# Altium footprint library d1_PcbLib.PcbLib: 266 footprints (part 7 of 17)
Each footprint in its own frame and in the unit in brackets; x right, y up, seen from the top. Pads: shape width x height; smd on the part's side, far side on the other; paste and mask are expansions set on the pad; w line width, h text height; cw(c..) or ccw(c..) is an arc to the next point about the centre after c.
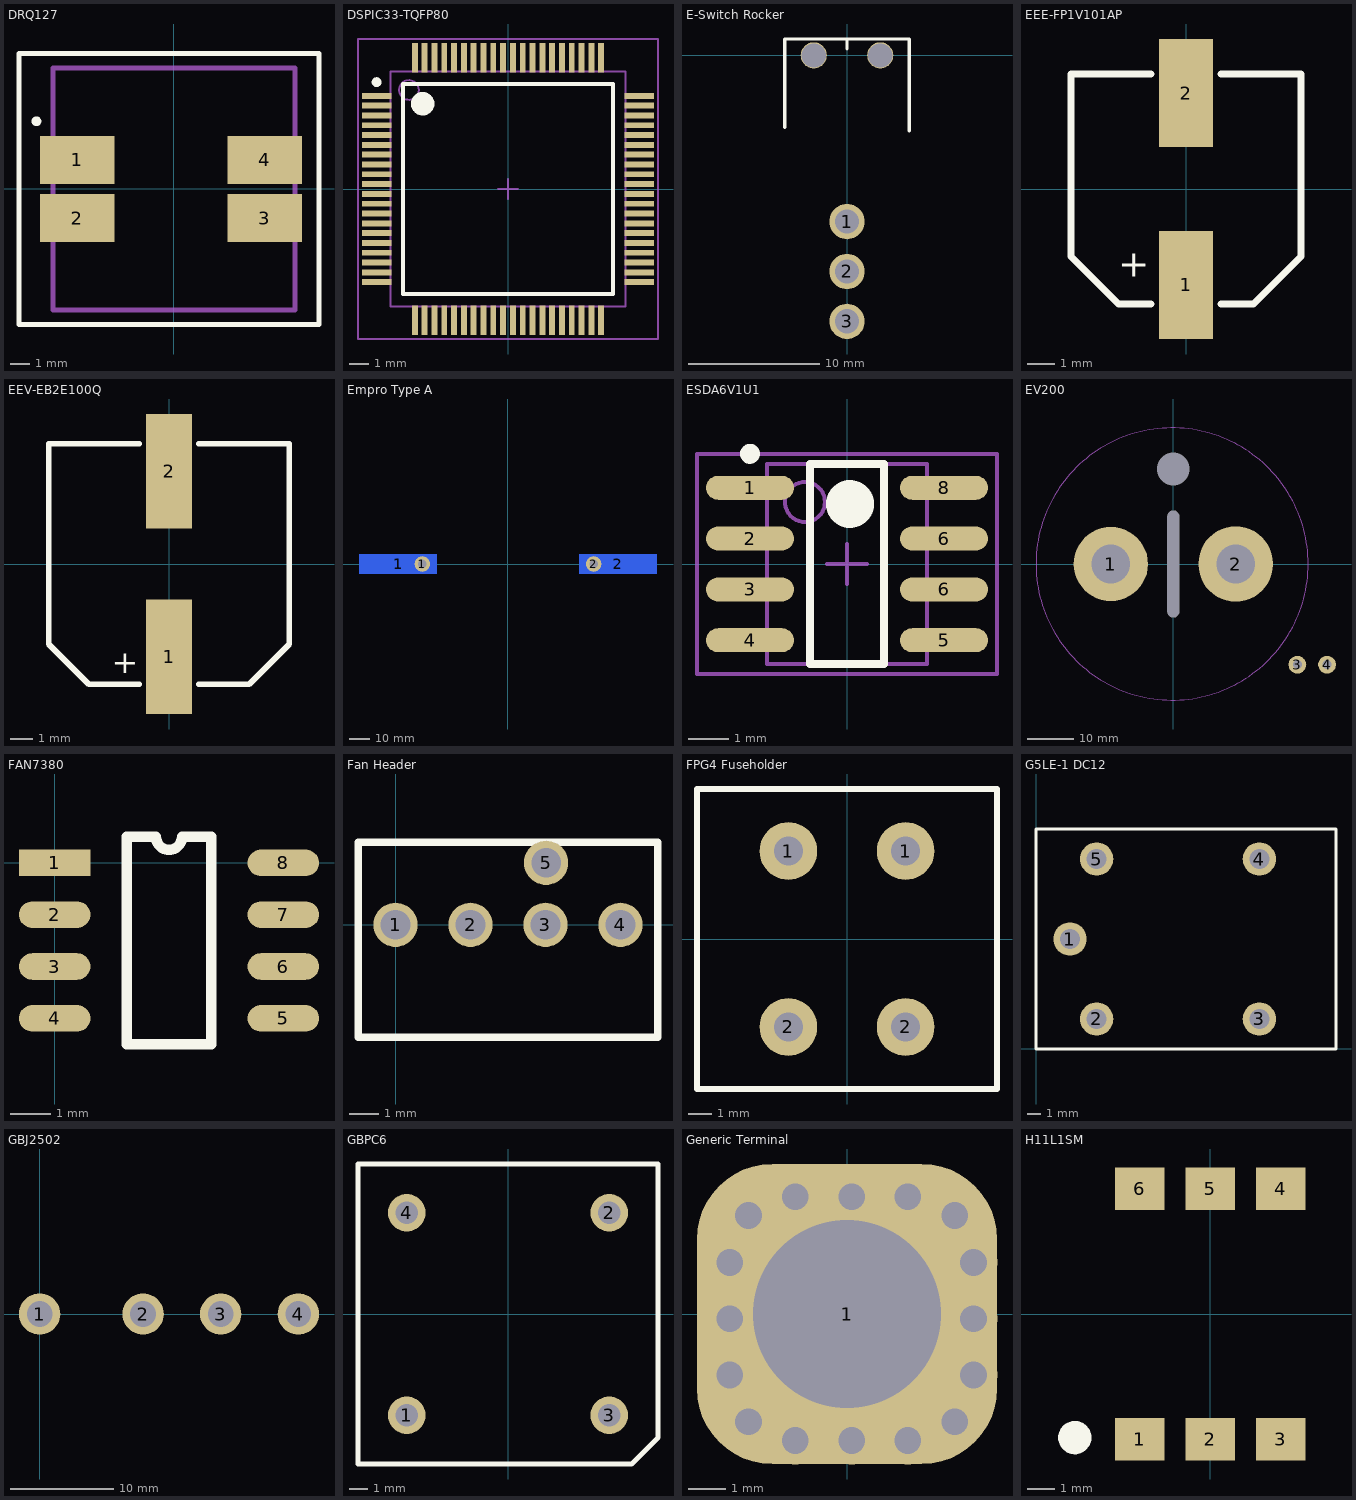
[diagram p6: the footprints below, top view; thin cyan lines are the x and y axes]

## DRQ127 [mm]
pads (4):
  rect 3.85x2.5 smd: 1(-5,1.5) 2(-5,-1.5) 3(4.7,-1.5) 4(4.7,1.5)
Top Overlay:
  circle w0.254: c-7.1,3.5 r0.125
  lines w0.254: -8,-7 -8,7 7.5,7 7.5,-7 -8,-7
Mechanical 1:
  lines w0.254: -6.25,-6.25 -6.25,6.25 6.25,6.25 6.25,-6.25 -6.25,-6.25
3D body: height 8, standoff 0, extent -6.25,-6.25 6.25,6.25

## DSPIC33-TQFP80 [mm] "TSQFP, 80-Leads, Body 14.0x14.0mm (max), Pitch 0.50mm, IPC Medium Density"
height 1.2
pads (80):
  rect 1.5x0.3 smd: 1(-6.7,4.75) 2(-6.7,4.25) 3(-6.7,3.75) 4(-6.7,3.25) 5(-6.7,2.75) 6(-6.7,2.25) 7(-6.7,1.75) 8(-6.7,1.25) 9(-6.7,0.75) 10(-6.7,0.25) 11(-6.7,-0.25) 12(-6.7,-0.75) 13(-6.7,-1.25) 14(-6.7,-1.75) 15(-6.7,-2.25) 16(-6.7,-2.75) 17(-6.7,-3.25) 18(-6.7,-3.75) 19(-6.7,-4.25) 20(-6.7,-4.75) 41(6.7,-4.75) 42(6.7,-4.25) 43(6.7,-3.75) 44(6.7,-3.25) 45(6.7,-2.75) 46(6.7,-2.25) 47(6.7,-1.75) 48(6.7,-1.25) 49(6.7,-0.75) 50(6.7,-0.25) 51(6.7,0.25) 52(6.7,0.75) 53(6.7,1.25) 54(6.7,1.75) 55(6.7,2.25) 56(6.7,2.75) 57(6.7,3.25) 58(6.7,3.75) 59(6.7,4.25) 60(6.7,4.75)
  rect 0.3x1.5 smd: 21(-4.75,-6.7) 22(-4.25,-6.7) 23(-3.75,-6.7) 24(-3.25,-6.7) 25(-2.75,-6.7) 26(-2.25,-6.7) 27(-1.75,-6.7) 28(-1.25,-6.7) 29(-0.75,-6.7) 30(-0.25,-6.7) 31(0.25,-6.7) 32(0.75,-6.7) 33(1.25,-6.7) 34(1.75,-6.7) 35(2.25,-6.7) 36(2.75,-6.7) 37(3.25,-6.7) 38(3.75,-6.7) 39(4.25,-6.7) 40(4.75,-6.7) 61(4.75,6.7) 62(4.25,6.7) 63(3.75,6.7) 64(3.25,6.7) 65(2.75,6.7) 66(2.25,6.7) 67(1.75,6.7) 68(1.25,6.7) 69(0.75,6.7) 70(0.25,6.7) 71(-0.25,6.7) 72(-0.75,6.7) 73(-1.25,6.7) 74(-1.75,6.7) 75(-2.25,6.7) 76(-2.75,6.7) 77(-3.25,6.7) 78(-3.75,6.7) 79(-4.25,6.7) 80(-4.75,6.7)
Top Overlay:
  circle w0.25: c-6.7,5.45 r0.125
  circle w0.6: c-4.35,4.35 r0.3
  lines w0.2: -5.35,-5.35 -5.35,5.35 5.35,5.35 5.35,-5.35 -5.35,-5.35
Mechanical 13:
  circle w0.1: c-5.05,5.05 r0.5
  lines w0.1: -6,-6 -6,6 6,6 6,-6 -6,-6
Mechanical 15:
  lines w0.1: -0.5,0 0.5,0 ; 0,-0.5 0,0.5 ; -7.65,-7.65 -7.65,7.65 7.65,7.65 7.65,-7.65 -7.65,-7.65
3D body: height 1.2, standoff 0.05, extent -6,-6 6,6

## E-Switch Rocker [mm] "For part 300SP1J1BLKM7QE"
pads (5):
  round 2.7 hole 1.85: 1(0,-12.7) 2(0,-16.51) 3(0,-20.32)
  round 2 hole 1.85: ""(-2.54,0) ""(2.54,0)
Top Overlay:
  lines w0.254: -4.75,-5.5 -4.75,-0.5 ; -4.75,-0.75 -4.75,1.25 ; -4.63,1.25 4.63,1.25 ; 0,0.5 0,1.25 ; 4.75,-5.75 4.75,-0.75 4.75,1.25
3D body: height 12.7, standoff 0, extent -4.699,-21.971 4.572,1.143

## EEE-FP1V101AP [mm]
pads (2):
  rect 2x4 smd: 1(0,-3.55) 2(0,3.55)
Top Overlay:
  lines w0.254: -1.3,-4.25 -2.5,-4.25 -4.25,-2.5 -4.25,4.25 -1.3,4.25 ; 1.3,-4.25 2.5,-4.25 4.25,-2.5 4.25,4.25 1.3,4.25
  text "+" at -2.5,-3.25 h1.02

## EEV-EB2E100Q [mm]
pads (2):
  rect 2x5 smd: 1(0,-4.05) 2(0,4.05)
Top Overlay:
  lines w0.254: -1.3,-5.25 -3.5,-5.25 -5.25,-3.5 -5.25,5.25 -1.3,5.25 ; 1.3,-5.25 3.5,-5.25 5.25,-3.5 5.25,5.25 1.3,5.25
  text "+" at -2.502,-4.763 h1.02

## Empro Type A [mil]
pads (4):
  rect 1500x375 smd far side: 1(-2125,0) 2(2125,0)
  round 300 hole 165: 1(-1656.25,0) 2(1656.25,0)
Bottom Overlay:
  lines w20: -2900,-211 -2900,210.5 2901.5,210.5 2901.5,-211 -2900,-211
3D body: height 625, standoff 0, extent -2875,-188 2875.5,187

## ESDA6V1U1 [mm] "SOP, 8-Leads, Body 5.0x4.0mm (max), Pitch 1.27mm, IPC Medium Density"
height 1.75
pads (8):
  oval 2.2x0.6 smd: 1(-2.425,1.905) 2(-2.425,0.635) 3(-2.425,-0.635) 4(-2.425,-1.905) 5(2.425,-1.905) 6(2.425,-0.635) 6(2.425,0.635) 8(2.425,1.905)
Top Overlay:
  circle w0.6: c0.075,1.5 r0.3
  circle w0.25: c-2.425,2.755 r0.125
  lines w0.2: -0.925,-2.5 0.925,-2.5 0.925,2.5 -0.925,2.5 -0.925,-2.5
Mechanical 13:
  circle w0.1: c-1.05,1.55 r0.5
  lines w0.1: -2,-2.5 2,-2.5 2,2.5 -2,2.5 -2,-2.5
Mechanical 15:
  lines w0.1: -0.5,0 0.5,0 ; 0,-0.5 0,0.5 ; -3.75,-2.75 3.75,-2.75 3.75,2.75 -3.75,2.75 -3.75,-2.75
3D body: height 1.75, standoff 0.19, extent -2,-2.5 2,2.5

## EV200 [mil]
pads (6):
  rrect50% 0x0 hole 100 slot 900 at 90 deg: 0(0,0)
  round 0 hole 275: 0(0,800)
  round 625 hole 325: 1(-525,0)
  oval 625x635 hole 325: 2(525,0)
  round 150 hole 75: 3(1044,-847) 4(1294,-847)
Mechanical 1:
  circle w10: c-10,0 r1145
3D body: height 1100, standoff -2200, extent -1579.61,-1436.52 1582,1144.52

## FAN7380 [mm]
height 5
pads (8):
  rect 1.75x0.65 smd: 1(0,0)
  oval 1.75x0.65 smd: 2(0,-1.27) 3(0,-2.54) 4(0,-3.81) 5(5.6,-3.81) 6(5.6,-2.54) 7(5.6,-1.27) 8(5.6,0)
Top Overlay:
  lines w0.254: 1.764,-4.445 3.836,-4.445 3.836,0.635 3.117,0.635 cw(c2.8,0.635) 2.482,0.635 1.764,0.635 1.764,-4.445

## Fan Header [mm] "4 Pin Fan Header"
height 10
pads (5):
  round 1.5 hole 1: 1(0,0) 2(2.54,0) 3(5.08,0) 4(7.62,0) 5(5.1,2.1)
Top Overlay:
  lines w0.254: -1.27,-3.81 8.89,-3.81 8.89,2.794 -1.27,2.794 -1.27,0 -1.27,-3.81
3D body: height 11.15, standoff -3.4, extent -1.185,-3.63 8.785,2.7

## FPG4 Fuseholder [mm] "Schurter 5mmx20mm Fuse Holder"
height 32.6
pads (4):
  round 2.5 hole 1.25: 1(-2.54,3.81) 1(2.54,3.81) 2(-2.54,-3.81) 2(2.54,-3.81)
Top Overlay:
  lines w0.254: -6.5,-6.5 -6.5,6.5 6.5,6.5 6.5,-6.5 -6.5,-6.5
3D body: height 32.6, standoff 0, extent -6.25,-6.25 6.201,6.225
3D body: height 3.8, standoff 0, extent -6.25,-6.25 6.25,6.25

## G5LE-1 DC12 [mm]
pads (5):
  round 2.5 hole 1.5: 1(2.55,8.25) 2(4.55,2.25) 3(16.75,2.25) 4(16.75,14.25) 5(4.55,14.25)
Top Overlay:
  lines w0.254: 0,0 0,16.5 22.5,16.5 22.5,0 0,0

## GBJ2502 [mm]
pads (4):
  round 4 hole 2.5: 1(0,0) 2(10,0) 3(17.5,0) 4(25,0)

## GBPC6 [mm]
pads (4):
  round 2 hole 1.2: 1(-5.4,-5.4) 2(5.4,5.4) 3(5.4,-5.4) 4(-5.4,5.4)
Top Overlay:
  lines w0.254: 8,-6.2 8,-6 ; -8,-8 6.6,-8 8,-6.6 8,8 -8,8 -8,-8

## Generic Terminal [mm]
pads (1):
  rrect50% 8x8 hole 5: 1(0,0)
via 3.374,1.375 diameter 1.27 hole 0.711
via 1.624,3.125 diameter 1.27 hole 0.711
via -1.376,3.125 diameter 1.27 hole 0.711
via -3.126,1.375 diameter 1.27 hole 0.711
via -3.126,-1.625 diameter 1.27 hole 0.711
via -1.376,-3.375 diameter 1.27 hole 0.711
via 1.624,-3.375 diameter 1.27 hole 0.711
via 3.374,-1.625 diameter 1.27 hole 0.711
via -2.626,-2.875 diameter 1.27 hole 0.711
via -2.626,2.625 diameter 1.27 hole 0.711
via 2.874,2.625 diameter 1.27 hole 0.711
via -3.126,-0.125 diameter 1.27 hole 0.711
via 3.374,-0.125 diameter 1.27 hole 0.711
via 0.124,3.125 diameter 1.27 hole 0.711
via 0.124,-3.375 diameter 1.27 hole 0.711
via 2.874,-2.875 diameter 1.27 hole 0.711

## H11L1SM [mm]
pads (6):
  rect 1.78x1.52 smd: 1(-2.54,-4.505) 2(0,-4.505) 3(2.54,-4.505) 4(2.54,4.505) 5(0,4.505) 6(-2.54,4.505)
Top Overlay:
  circle w0.6: c-4.872,-4.445 r0.3